# Altium footprint library FootprintHole.PcbLib: 100 footprints (part 1 of 7)
Each footprint in its own frame and in the unit in brackets; x right, y up, seen from the top. Pads: shape width x height; smd on the part's side, far side on the other; paste and mask are expansions set on the pad; w line width, h text height; cw(c..) or ccw(c..) is an arc to the next point about the centre after c.
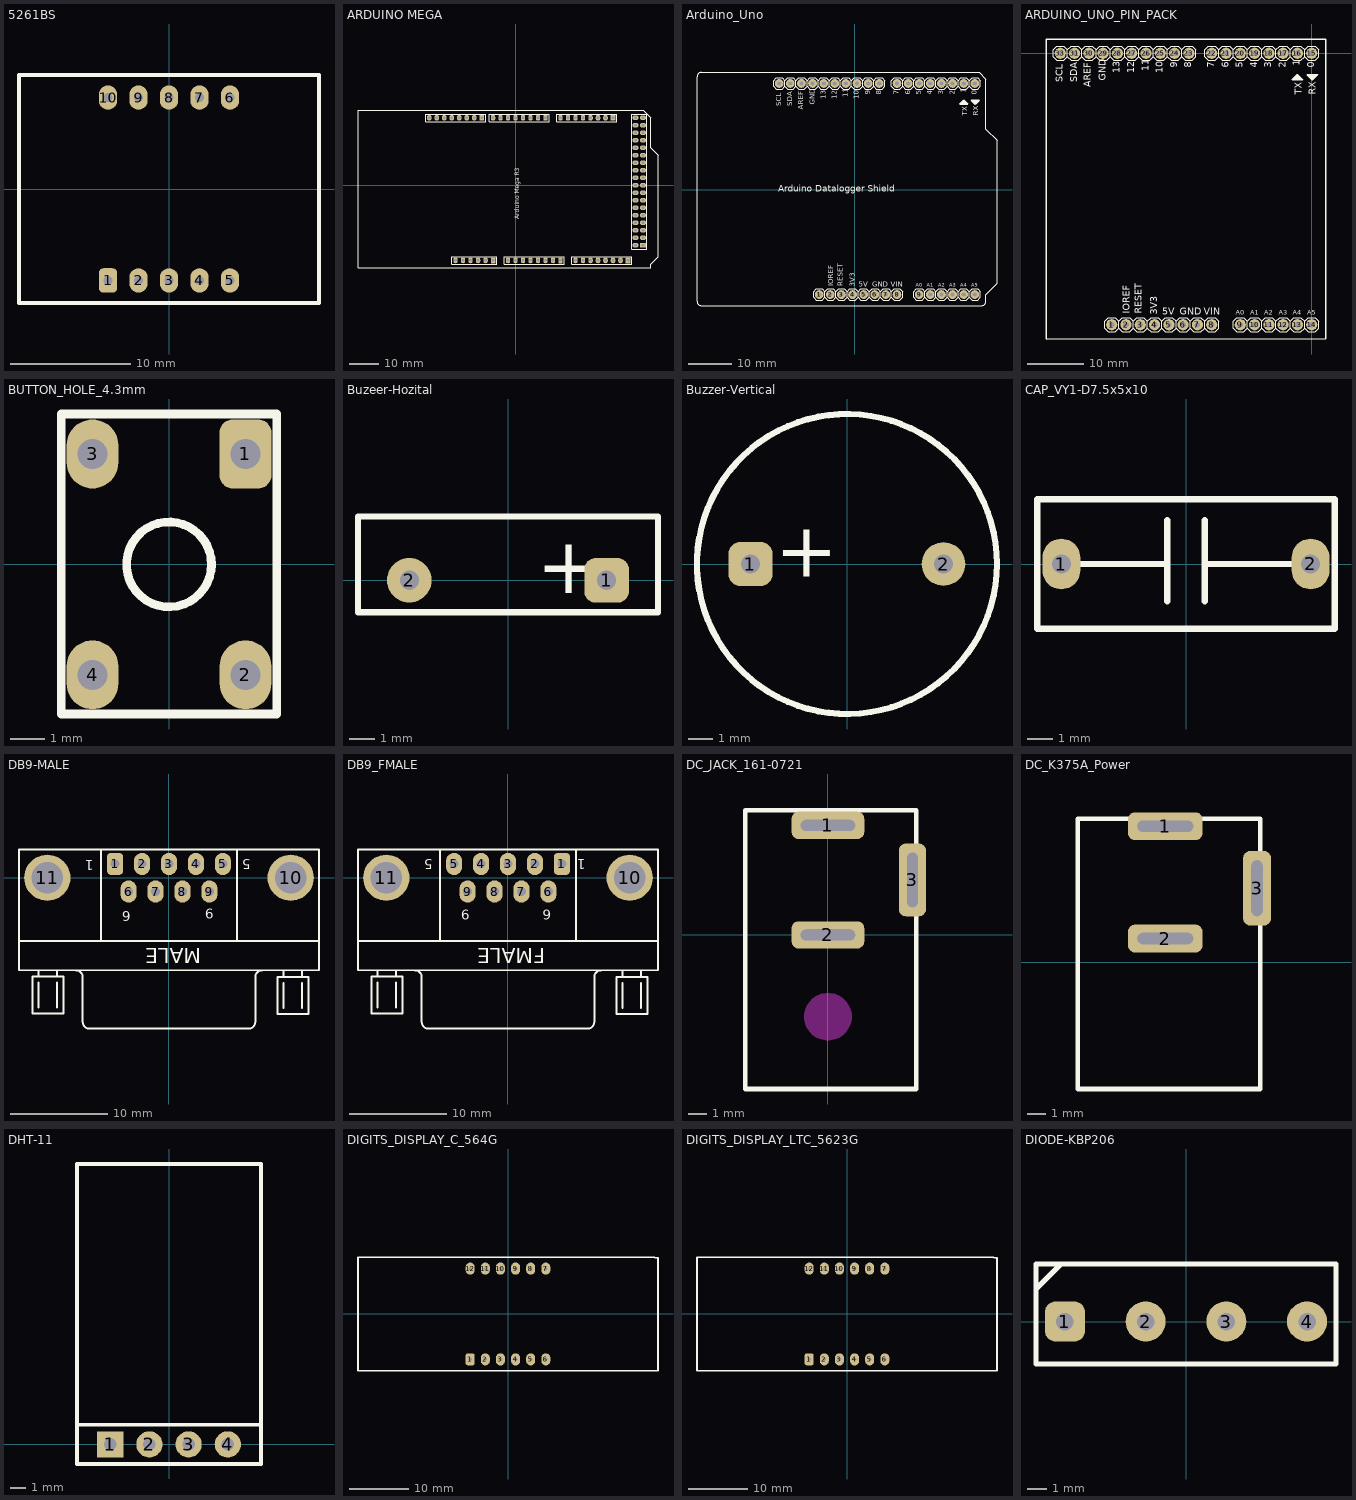
[diagram p0: the footprints below, top view; thin cyan lines are the x and y axes]

## 5261BS [mil]
pads (10):
  rrect50% 60x80 hole 30: 1(-200,-300)
  oval 60x80 hole 30: 2(-100,-300) 3(0,-300) 4(100,-300) 5(200,-300) 6(200,300) 7(100,300) 8(0,300) 9(-100,300) 10(-200,300)
Top Overlay:
  lines w11.81: -492.13,-374.02 -492.13,374.02 492.13,374.02 492.13,-374.02 -492.13,-374.02

## ARDUINO MEGA [mil]
pads (82):
  rect 60x80 hole 35: 0(400,900) 8(-450,900) 21(1300,900) 59(-300,-1000) 67(600,-1000) 75(1500,-1000)
  oval 60x80 hole 35: 1(300,900) 2(200,900) 3(100,900) 4(0,900) 5(-100,900) 6(-200,900) 7(-300,900) 9(-550,900) 10(-650,900) 11(-750,900) 12(-850,900) 13(-950,900) 14(600,900) 15(700,900) 16(800,900) 17(900,900) 18(1000,900) 19(1100,900) 20(1200,900) 54(-800,-1000) 55(-700,-1000) 56(-600,-1000) 57(-500,-1000) 58(-400,-1000) 60(-100,-1000) 61(0,-1000) 62(100,-1000) 63(200,-1000) 64(300,-1000) 65(400,-1000) 66(500,-1000) 68(800,-1000) 69(900,-1000) 70(1000,-1000) 71(1100,-1000) 72(1200,-1000) 73(1300,-1000) 74(1400,-1000) 76(-1050,900) 77(-1150,900)
  oval 80x60 hole 35: 22(1600,800) 23(1700,800) 24(1600,700) 25(1700,700) 26(1600,600) 27(1700,600) 28(1600,500) 29(1700,500) 30(1600,400) 31(1700,400) 32(1600,300) 33(1700,300) 34(1600,200) 35(1700,200) 36(1600,100) 37(1700,100) 38(1600,0) 39(1700,0) 40(1600,-100) 41(1700,-100) 42(1600,-200) 43(1700,-200) 44(1600,-300) 45(1700,-300) 46(1600,-400) 47(1700,-400) 48(1600,-500) 49(1700,-500) 50(1600,-600) 51(1700,-600) 52(1600,-700) 53(1700,-700) 78(1600,-800) 80(1700,900) 81(1600,900)
  rect 80x60 hole 35: 79(1700,-800)
Top Overlay:
  lines w7.87: -1200,850 -400,850 -400,950 -1200,950 -1200,850 ; -850,-1050 -850,-950 -250,-950 -250,-1050 -850,-1050 ; -350,850 450,850 450,950 -350,950 -350,850 ; -150,-1050 650,-1050 650,-950 -150,-950 -150,-1050 ; 550,850 550,950 1350,950 1350,850 550,850 ; 750,-1050 1550,-1050 1550,-950 750,-950 750,-1050 ; 1550,-850 1750,-850 1750,950 1550,950 1550,-850
  lines w10: 1800,499.61 1900,399.61 1900,-950 1800,-1050 1800,-1100 -2035.43,-1100 -2100,-1100 -2100,-1035.43 -2100,1000 1700,1000 1800,900 1800,500
  text "Arduino Mega R3" at 50,-450 h60

## Arduino_Uno [mm]
pads (32):
  round 2 hole 1: 1(-8.12,-24) 2(-5.58,-24) 3(-3.04,-24) 4(-0.5,-24) 5(2.04,-24) 6(4.58,-24) 7(7.12,-24) 8(9.66,-24) 9(14.74,-24) 10(17.28,-24) 11(19.82,-24) 12(22.36,-24) 13(24.9,-24) 14(27.44,-24) 15(27.44,24.26) 16(24.9,24.26) 17(22.36,24.26) 18(19.82,24.26) 19(17.28,24.26) 20(14.74,24.26) 21(12.2,24.26) 22(9.66,24.26) 23(5.596,24.26) 24(3.056,24.26) 25(0.516,24.26) 26(-2.024,24.26) 27(-4.564,24.26) 28(-7.104,24.26) 29(-9.644,24.26) 30(-12.184,24.26) 31(-14.724,24.26) 33(-17.264,24.26)
Top Overlay:
  drawing of 255 lines, arcs and shapes, not listed
  text "Arduino Datalogger Shield" at -17.5,-0.5 h1.52
  text "SDA" at -14.271,19.087 h1.21
  text "SCL" at -16.8,19.1 h1.21
  text "0" at 27.887,21.676 h1.21
  text "1" at 25.347,22.079 h1.21
  text "2" at 22.807,21.676 h1.21
  text "3" at 20.267,21.676 h1.21
  text "4" at 17.727,21.676 h1.21
  text "5" at 15.187,21.676 h1.21
  text "6" at 12.647,21.676 h1.21
  text "7" at 10.107,21.676 h1.21
  text "8" at 6.043,21.676 h1.21
  text "9" at 3.503,21.676 h1.21
  text "10" at 0.963,20.669 h1.21
  text "11" at -1.577,21.072 h1.21
  text "12" at -4.117,20.669 h1.21
  text "13" at -6.657,20.669 h1.21
  text "RX" at 28.202,16.894 h1.21
  text "TX" at 25.662,16.919 h1.21
  text "IOREF" at -4.945,-22.095 h1.21
  text "GND" at 3.97,-22.222 h1.21
  text "VIN" at 8.263,-22.222 h1.21
  text "A5" at 26.653,-22.197 h0.86
  text "A4" at 24.113,-22.197 h0.86
  text "A3" at 21.573,-22.197 h0.86
  text "A2" at 19.033,-22.197 h0.86
  text "A1" at 16.493,-22.197 h0.86
  text "3V3" at 0.008,-22.222 h1.21
  text "RESET" at -2.786,-22.095 h1.21
  text "GND" at -9.172,19.386 h1.21
  text "AREF" at -11.814,18.203 h1.21
  text "A0" at 13.953,-22.197 h0.86
  text "5V" at 0.897,-22.222 h1.21

## ARDUINO_UNO_PIN_PACK [mm]
pads (32):
  round 2 hole 1: 1(-35.56,-48.26) 2(-33.02,-48.26) 3(-30.48,-48.26) 4(-27.94,-48.26) 5(-25.4,-48.26) 6(-22.86,-48.26) 7(-20.32,-48.26) 8(-17.78,-48.26) 9(-12.7,-48.26) 10(-10.16,-48.26) 11(-7.62,-48.26) 12(-5.08,-48.26) 13(-2.54,-48.26) 14(0,-48.26) 15(0,0) 16(-2.54,0) 17(-5.08,0) 18(-7.62,0) 19(-10.16,0) 20(-12.7,0) 21(-15.24,0) 22(-17.78,0) 23(-21.844,0) 24(-24.384,0) 25(-26.924,0) 26(-29.464,0) 27(-32.004,0) 28(-34.544,0) 29(-37.084,0) 30(-39.624,0) 31(-42.164,0) 33(-44.704,0)
Top Overlay:
  drawing of 247 lines, arcs and shapes, not listed
  text "SDA" at -41.711,-5.173 h1.21
  text "SCL" at -44.24,-5.16 h1.21
  text "0" at 0.447,-2.584 h1.21
  text "1" at -2.093,-2.181 h1.21
  text "2" at -4.633,-2.584 h1.21
  text "3" at -7.173,-2.584 h1.21
  text "4" at -9.713,-2.584 h1.21
  text "5" at -12.253,-2.584 h1.21
  text "6" at -14.793,-2.584 h1.21
  text "7" at -17.333,-2.584 h1.21
  text "8" at -21.397,-2.584 h1.21
  text "9" at -23.937,-2.584 h1.21
  text "10" at -26.477,-3.591 h1.21
  text "11" at -29.017,-3.188 h1.21
  text "12" at -31.557,-3.591 h1.21
  text "13" at -34.097,-3.591 h1.21
  text "RX" at 0.762,-7.366 h1.21
  text "TX" at -1.778,-7.341 h1.21
  text "IOREF" at -32.385,-46.355 h1.21
  text "GND" at -23.47,-46.482 h1.21
  text "VIN" at -19.177,-46.482 h1.21
  text "A5" at -0.787,-46.457 h0.86
  text "A4" at -3.327,-46.457 h0.86
  text "A3" at -5.867,-46.457 h0.86
  text "A2" at -8.407,-46.457 h0.86
  text "A1" at -10.947,-46.457 h0.86
  text "3V3" at -27.432,-46.482 h1.21
  text "RESET" at -30.226,-46.355 h1.21
  text "GND" at -36.612,-4.874 h1.21
  text "AREF" at -39.254,-6.057 h1.21
  text "A0" at -13.487,-46.457 h0.86
  text "5V" at -26.543,-46.482 h1.21

## BUTTON_HOLE_4.3mm [mil]
pads (4):
  rrect50% 60x80 hole 35: 1(88.58,127.95)
  oval 60x80 hole 35: 2(88.58,-127.95) 3(-88.58,127.95) 4(-88.58,-127.95)
Top Overlay:
  circle w10: c0,0 r49.21
  lines w10: -125,-173.23 125,-173.23 125,174.21 -125,174.21 -125,-173.23
3D body "button_hole_6x6x4.3.stp": height 169.29, standoff -137.8, extent -118.1,-152.09 118.12,152.1

## Buzeer-Hozital [mil]
pads (2):
  rrect50% 70x70 hole 30: 1(154.53,0)
  round 70 hole 30: 2(-154.53,0)
Top Overlay:
  lines w10: -235,-50 235,-50 235,100 -235,100 -235,-50
  text "+" at 45,-48.88 h150
3D body "BuzzerHozital.STEP": height 333.27, standoff -214.96, extent -232.79,-13.38 233.74,777.96

## Buzzer-Vertical [mil]
pads (2):
  rrect50% 70x70 hole 30: 1(-154.53,0)
  round 70 hole 30: 2(154.53,0)
Top Overlay:
  circle w10: c0,0 r240.16
  text "+" at -115,-48.88 h150
3D body "Buzzer_Active.stp": height 377.95, standoff -102.36, extent -233.26,-233.26 233.28,233.27

## CAP_VY1-D7.5x5x10 [mil]
pads (2):
  oval 60x80 hole 30: 1(-196.85,0) 2(196.85,0)
Top Overlay:
  lines w10: -167.32,0 -29.53,0 ; -29.53,-59.06 -29.53,68.9 ; 29.53,-59.06 29.53,68.9 ; 29.53,0 167.32,0 ; -235,-102.36 -235,102.36 235,102.36 235,-102.36 -235,-102.36
3D body "VY1-D7.5x5x10.stp": height 452.73, standoff -98.43, extent -220.28,-98.38 220.29,98.38

## DB9-MALE [mil]
pads (11):
  rrect50% 65x90 hole 35: 1(-218.11,55.91)
  oval 65x90 hole 35: 2(-109.05,55.91) 3(0,55.91) 4(109.06,55.91) 5(218.11,55.91) 6(-163.58,-55.91) 7(-54.53,-55.91) 8(54.53,-55.91) 9(163.58,-55.91)
  round 187.4 hole 128.35: 10(491.93,0) 11(-491.93,0)
Top Overlay:
  lines w7.87: -606.3,-255.91 606.3,-255.91 ; -376.38,-374.21 cw(c-376.38,-401.57) -349.02,-401.57 -349.02,-582.68 ; -348.82,-582.87 ccw(c-321.46,-582.87) -321.46,-610.24 321.46,-610.24 ccw(c321.46,-582.87) 348.82,-582.87 ; -275.59,-255.91 -275.59,114.17 ; 275.59,-255.91 275.59,114.17 ; 349.02,-582.68 349.02,-401.57 cw(c376.38,-401.57) 376.38,-374.21 ; -606.3,-374.02 -606.3,114.17 606.3,114.17 606.3,-374.02 -606.3,-374.02
  lines w8: -527,-524.02 -527,-424.02 ; -527,-399.02 -527,-374.02 ; -452,-524.02 -452,-424.02 ; -452,-399.02 -452,-374.02 ; 463,-526.02 463,-426.02 ; 463,-401.02 463,-376.02 ; 538,-526.02 538,-426.02 ; 538,-401.02 538,-376.02 ; -552,-549.02 -552,-399.02 -427,-399.02 -427,-549.02 -552,-549.02 ; 438,-551.02 438,-401.02 563,-401.02 563,-551.02 438,-551.02
  text "MALE" at 130,-285 h60
  text "1" at -305,70 h40
  text "5" at 330,75 h40
  text "9" at 180,-125 h40
  text "6" at -155,-135 h40
3D body "SW3dPS-9-PIN_DSUB.STEP": height 494.6, standoff -124.4, extent -610,-637 606,138

## DB9_FMALE [mil]
pads (11):
  rrect50% 65x90 hole 35: 1(218.11,55.91)
  oval 65x90 hole 35: 2(109.06,55.91) 3(0,55.91) 4(-109.05,55.91) 5(-218.11,55.91) 6(163.58,-55.91) 7(54.53,-55.91) 8(-54.53,-55.91) 9(-163.58,-55.91)
  round 187.4 hole 128.35: 10(491.93,0) 11(-491.93,0)
Top Overlay:
  lines w7.87: -606.3,-255.91 606.3,-255.91 ; -376.38,-374.21 cw(c-376.38,-401.57) -349.02,-401.57 -349.02,-582.68 ; -348.82,-582.87 ccw(c-321.46,-582.87) -321.46,-610.24 321.46,-610.24 ccw(c321.46,-582.87) 348.82,-582.87 ; -275.59,-255.91 -275.59,114.17 ; 275.59,-255.91 275.59,114.17 ; 349.02,-582.68 349.02,-401.57 cw(c376.38,-401.57) 376.38,-374.21 ; -606.3,-374.02 -606.3,114.17 606.3,114.17 606.3,-374.02 -606.3,-374.02
  lines w8: -527,-524.02 -527,-424.02 ; -527,-399.02 -527,-374.02 ; -452,-524.02 -452,-424.02 ; -452,-399.02 -452,-374.02 ; 463,-526.02 463,-426.02 ; 463,-401.02 463,-376.02 ; 538,-526.02 538,-426.02 ; 538,-401.02 538,-376.02 ; -552,-549.02 -552,-399.02 -427,-399.02 -427,-549.02 -552,-549.02 ; 438,-551.02 438,-401.02 563,-401.02 563,-551.02 438,-551.02
  text "1" at 315,75 h40
  text "5" at -305,75 h40
  text "9" at -155,-130 h40
  text "6" at 175,-130 h40
  text "FMALE" at 150,-285 h60
3D body "SW3dPS-9-PIN_DSUB-1.STEP": height 494.6, standoff -124.4, extent -608.5,-613 604.5,138

## DC_JACK_161-0721 [mm]
pads (3):
  rrect50% 4x1.5 hole 0.6 slot 3 at 0 deg: 1(0,6.025) 2(0,0)
  rrect50% 1.5x4 hole 0.6 slot 3 at 90 deg: 3(4.65,3.025)
Top Overlay:
  lines w0.254: -4.55,-8.475 4.85,-8.475 4.85,6.85 -4.55,6.85 -4.55,-8.475
Keep-Out Layer:
  board cut-out: -1.3,-4.5 -1.3,-4.628 -1.25,-4.879 -1.152,-5.116 -1.01,-5.329 -0.829,-5.51 -0.616,-5.652 -0.379,-5.75 -0.128,-5.8 0,-5.8 0.128,-5.8 0.379,-5.75 0.616,-5.652 0.829,-5.51 1.01,-5.329 1.152,-5.116 1.25,-4.879 1.3,-4.628 1.3,-4.5 1.3,-4.372 1.25,-4.121 1.152,-3.884 1.01,-3.671 0.829,-3.49 0.616,-3.348 0.379,-3.25 0.128,-3.2 0,-3.2 -0.128,-3.2 -0.379,-3.25 -0.616,-3.348 -0.829,-3.49 -1.01,-3.671 -1.152,-3.884 -1.25,-4.121 -1.3,-4.372
3D body "User Library-Kobiconn_Lockable_DC_jack_161-0721-EX.STEP": height 11.5, standoff -3, extent -4.528,-8.5 4.828,6.8

## DC_K375A_Power [mm]
pads (3):
  rrect50% 4x1.5 hole 0.6 slot 3 at 0 deg: 1(-13,7.3) 2(-13,1.275)
  rrect50% 1.5x4 hole 0.6 slot 3 at 90 deg: 3(-8.075,3.975)
Top Overlay:
  lines w0.254: -17.7,-6.8 -17.7,7.7 -7.9,7.7 -7.9,-6.8 -17.7,-6.8
3D body "User Library-K375A -PCM DC Power Jack 2mm Pin.sldprt": height 11, standoff -5.1, extent -17.7,-6.8 -7.9,7.7

## DHT-11 [mm]
pads (4):
  rect 1.7x1.7 hole 0.8: 1(-3.81,0)
  round 1.7 hole 0.8: 2(-1.27,0) 3(1.27,0) 4(3.81,0)
Top Overlay:
  lines w0.25: -5.969,1.27 5.969,1.27 ; -5.969,-1.27 5.969,-1.27 5.969,18.161 -5.969,18.161 -5.969,-1.27
3D body "User Library-DHT11-right.STEP": height 5.5, standoff -2.6, extent -6,-0.35 6,18.15

## DIGITS_DISPLAY_C_564G [mil]
pads (12):
  rrect50% 60x80 hole 25: 1(-250,-300)
  oval 60x80 hole 25: 2(-150,-300) 3(-50,-300) 4(50,-300) 5(150,-300) 6(250,-300) 7(250,300) 8(150,300) 9(50,300) 10(-50,300) 11(-150,300) 12(-250,300)
Top Overlay:
  lines w10: -992.13,-374.02 992.13,-374.02 992.13,373.58 971.11,373.58 971.11,374.02 -920.68,374.02 -992.13,374.02 -992.13,-374.02
3D body "User Library-C-564 (7 segment 4 digit LED display).STEP": height 314.96, standoff -244.09, extent -992.12,-374.02 992.12,374.02

## DIGITS_DISPLAY_LTC_5623G [mil]
pads (12):
  rrect50% 60x80 hole 25: 1(-250,-300)
  oval 60x80 hole 25: 2(-150,-300) 3(-50,-300) 4(50,-300) 5(150,-300) 6(250,-300) 7(250,300) 8(150,300) 9(50,300) 10(-50,300) 11(-150,300) 12(-250,300)
Top Overlay:
  lines w10: -992.13,-374.02 -992.13,374.02 -920.68,374.02 971.11,374.02 971.11,373.58 992.13,373.58 992.13,-374.02 -992.13,-374.02
3D body "User Library-LTC-5623G.STEP": height 314.96, standoff -307.09, extent -990.16,-374.02 990.16,374.02

## DIODE-KBP206 [mil]
pads (4):
  rrect50% 80x80 hole 35: 1(-242.13,0)
  round 80 hole 35: 2(-80.71,0) 3(80.71,0) 4(242.13,0)
Top Overlay:
  lines w10: -300,65 -250,115 ; -300,-85 -300,115 300,115 300,-85 -300,-85
3D body "KBP206.step": height 529.92, standoff -528.35, extent -300,-85 300,115